# Altium footprint library mastermind.PCBLIB: 1061 footprints (part 8 of 67)
Each footprint in its own frame and in the unit in brackets; x right, y up, seen from the top. Pads: shape width x height; smd on the part's side, far side on the other; paste and mask are expansions set on the pad; w line width, h text height; cw(c..) or ccw(c..) is an arc to the next point about the centre after c.
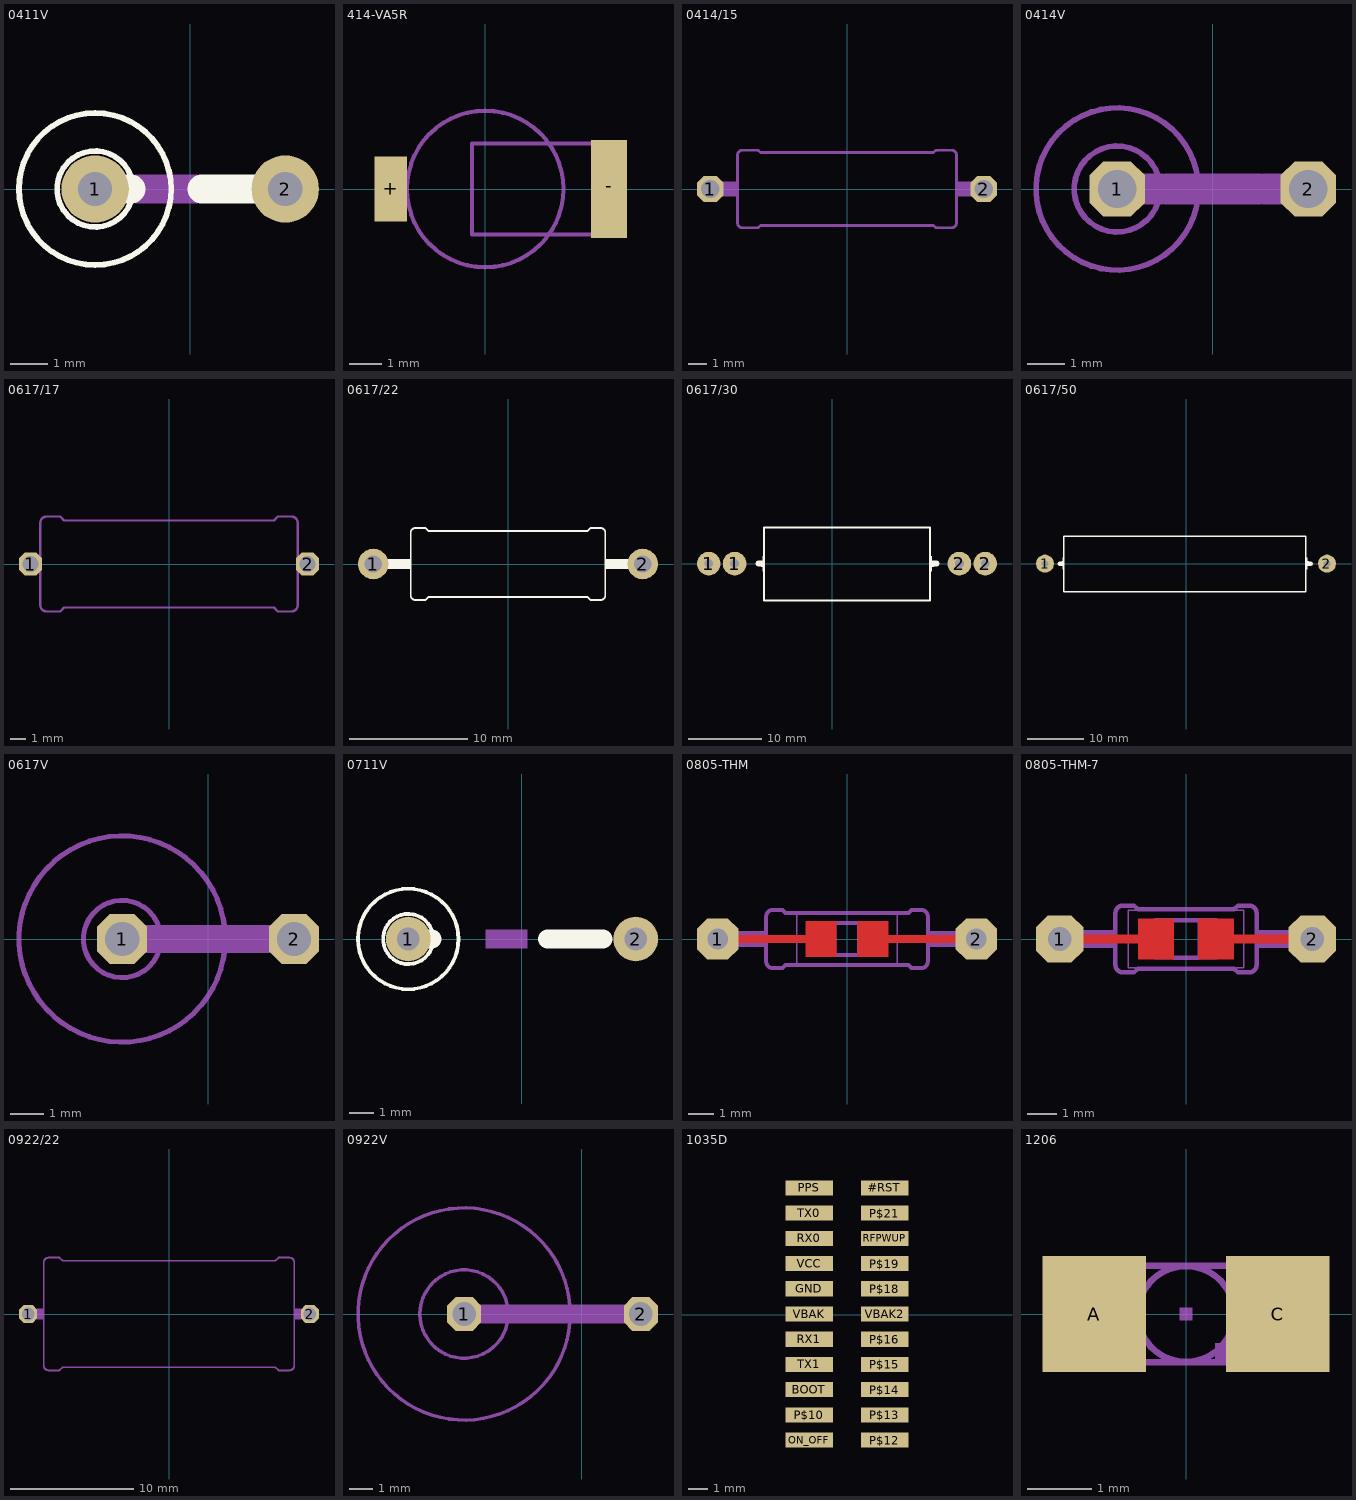
[diagram p7: the footprints below, top view; thin cyan lines are the x and y axes]

## 0411V [mm]
pads (2):
  round 1.8 hole 0.914: 1(-2.54,0) 2(2.54,0)
Top Overlay:
  circle w0.152: c-2.54,0 r2.032
  circle w0.152: c-2.54,0 r1.016
  lines w0.762: -2.54,0 -1.575,0 ; 0.305,0 2.54,0
Mechanical 2:
  region: -1.473,-0.381 -1.473,0.381 0.203,0.381 0.203,-0.381
3D body "Fuse1.STEP": height 11.69, standoff -3, extent -4.44,-1.9 2.895,1.9

## 414-VA5R [mm]
pads (2):
  rect 1x2 smd: +(-2.9,0)
  rect 1.1x3 smd: -(3.8,0)
Mechanical 2:
  circle w0.127: c0,0 r2.4
Mechanical 6:
  lines w0.127: -0.4,-1.4 4.1,-1.4 4.1,1.4 -0.4,1.4 -0.4,-1.4

## 0414/15 [mil]
pads (2):
  oct 58.09x58.09 hole 40: 1(-300,0) 2(300,0)
Mechanical 2:
  region: 240,-16 240,16 256,16 256,-16
  region: -256,-16 -256,16 -240,16 -240,-16
  lines w6: -240,-75 ccw(c-230,-75) -230,-85 -195,-85 -190,-80 190,-80 195,-85 230,-85 ccw(c230,-75) 240,-75 240,75 ccw(c230,75) 230,85 195,85 190,80 -190,80 -195,85 -230,85 ccw(c-230,75) -240,75 -240,-75
Mechanical 8:
  lines w32: -300,0 -260,0 ; 260,0 300,0

## 0414V [mil]
pads (2):
  oct 58.09x58.09 hole 40: 1(-100,0) 2(100,0)
Mechanical 2:
  circle w6: c-100,0 r85
  region: -51,-16 -51,16 51,16 51,-16
Mechanical 8:
  circle w6: c-100,0 r45
  lines w32: -100,0 -55,0 ; 55,0 100,0

## 0617/17 [mil]
pads (2):
  oct 58.09x58.09 hole 40: 1(-350,0) 2(350,0)
Mechanical 2:
  lines w6: -325,-40 -325,-105 ccw(c-310,-105) -310,-120 -275,-120 -265,-110 265,-110 275,-120 310,-120 ccw(c310,-105) 325,-105 325,-40 ; -325,40 -325,105 cw(c-310,105) -310,120 -275,120 -265,110 265,110 275,120 310,120 cw(c310,105) 325,105 325,40
Mechanical 8:
  region: -336,-16 -336,16 -324,16 -324,-16
  region: 324,-16 324,16 336,16 336,-16
  lines w6: -325,-40 -325,40 ; 325,-40 325,40
  lines w32: -350,0 -340,0 ; 340,0 350,0

## 0617/22 [mm]
pads (2):
  round 2.6 hole 1.476: 1(-11.43,0) 2(11.43,0)
Top Overlay:
  region: -10.185,-0.406 -10.185,0.406 -8.255,0.406 -8.255,-0.406
  region: 8.255,-0.406 8.255,0.406 10.185,0.406 10.185,-0.406
  lines w0.152: -8.255,-2.667 ccw(c-7.874,-2.667) -7.874,-3.048 -6.985,-3.048 -6.731,-2.794 6.731,-2.794 6.985,-3.048 7.874,-3.048 ccw(c7.874,-2.667) 8.255,-2.667 8.255,2.667 ccw(c7.874,2.667) 7.874,3.048 6.985,3.048 6.731,2.794 -6.731,2.794 -6.985,3.048 -7.874,3.048 ccw(c-7.874,2.667) -8.255,2.667 -8.255,-2.667
Mechanical 8:
  lines w0.813: -11.43,0 -10.287,0 ; 10.287,0 11.43,0
3D body "User Library-RES-3W.STEP": height 6.5, standoff -3, extent -11.8,-3.3 11.86,3.2

## 0617/30 [mm]
pads (4):
  round 3.2 hole 1.2: 1(-16.75,0) 1(-13.25,0) 2(17.25,0) 2(20.75,0)
Top Overlay:
  region: -9.644,-0.406 -9.644,0.406 -9.34,0.406 -9.34,-0.406
  region: 13.467,-0.406 13.467,0.406 13.771,0.406 13.771,-0.406
  lines w0.152: -9.365,-1.016 -9.365,1.016 ; 13.492,-1.016 13.492,1.016
  lines w0.254: -9.25,-5 13.25,-5 13.25,4.888 -9.25,4.888 -9.25,-5
  lines w0.813: -10,0 -9.746,0 ; 13.873,0 14.127,0
3D body "RES_SQPH_5W_1200mil_0R_J(5%).STEP": height 10, standoff -3.6, extent -13.63,-5 17.75,5

## 0617/50 [mm]
pads (2):
  round 3.2 hole 1.2: 1(-25,0) 2(25,0)
Top Overlay:
  region: -22.044,-0.406 -22.044,0.406 -21.74,0.406 -21.74,-0.406
  region: 21.467,-0.406 21.467,0.406 21.771,0.406 21.771,-0.406
  lines w0.152: -21.765,-1.016 -21.765,1.016 ; 21.492,-1.016 21.492,1.016
  lines w0.254: -21.65,-5 21.25,-5 21.25,4.888 -21.65,4.888 -21.65,-5
  lines w0.813: -22.4,0 -22.146,0 ; 21.873,0 22.127,0
3D body "RES_SQPH_10W_2000mil_0R_J(5%).STEP": height 10, standoff -3.6, extent -25.85,-5 25.85,5

## 0617V [mil]
pads (2):
  oct 58.09x58.09 hole 40: 1(-100,0) 2(100,0)
Mechanical 2:
  circle w6: c-100,0 r120
  region: -52,-16 -52,16 52,16 52,-16
Mechanical 8:
  circle w6: c-100,0 r45
  lines w32: -100,0 -50,0 ; 50,0 100,0

## 0711V [mm]
pads (2):
  round 1.8 hole 0.914: 1(-4.6,0) 2(4.6,0)
Top Overlay:
  circle w0.152: c-4.6,0 r1.016
  circle w0.152: c-4.6,0 r2.032
  lines w0.762: -4.6,0 -3.635,0 ; 1.035,0 3.27,0
Mechanical 2:
  region: -1.473,-0.381 -1.473,0.381 0.203,0.381 0.203,-0.381
3D body "Fuse1.STEP": height 11.69, standoff -3, extent -3.95,-1.9 3.385,1.9

## 0805-THM [mil]
pads (2):
  oct 63.9x63.9 hole 32: 1(-200,0) 2(200,0)
Top Layer:
  region: 16.75,-27.56 16.75,27.56 63.99,27.56 63.99,-27.56
  region: -63.99,-27.56 -63.99,27.56 -16.75,27.56 -16.75,-27.56
  lines w12: -177.17,0 -43.31,0 ; 39.37,0 200.79,0
Top Paste:
  region: 16.75,-27.56 16.75,27.56 63.99,27.56 63.99,-27.56
  region: -63.99,-27.56 -63.99,27.56 -16.75,27.56 -16.75,-27.56
Top Solder:
  region: 12.81,-31.5 12.81,31.5 67.93,31.5 67.93,-31.5
  region: -67.93,-31.5 -67.93,31.5 -12.81,31.5 -12.81,-31.5
Mechanical 2:
  region: -42,-27.5 -42,27.62 -16.41,27.62 -16.41,-27.5
  region: 16,-27.5 16,27.62 41.59,27.62 41.59,-27.5
  region: -159,-12 -159,12 -125,12 -125,-12
  region: 125,-12 125,12 159,12 159,-12
  lines w6: -125,-35 ccw(c-115,-35) -115,-45 -100,-45 -95,-40 95,-40 100,-45 115,-45 ccw(c115,-35) 125,-35 125,35 ccw(c115,35) 115,45 100,45 95,40 -95,40 -100,45 -115,45 ccw(c-115,35) -125,35 -125,-35
Mechanical 8:
  lines w6: -16.14,-25 16.14,-25 ; -16.14,25 16.14,25
  lines w24: -200,0 -160,0 ; 160,0 200,0
Mechanical 29 (Mech34):
  lines w2: -77.68,-38.7 -77.68,38.7 77.68,38.7 77.68,-38.7 -77.68,-38.7

## 0805-THM-7 [mil]
pads (2):
  oct 63.9x63.9 hole 32: 1(-170,0) 2(170,0)
Top Layer:
  region: 16.75,-27.56 16.75,27.56 63.99,27.56 63.99,-27.56
  region: -63.99,-27.56 -63.99,27.56 -16.75,27.56 -16.75,-27.56
  lines w12: -147.17,0 -43.31,0 ; 39.37,0 170.79,0
Top Paste:
  region: 15.75,-27.56 15.75,27.56 64.57,27.56 64.57,-27.56
  region: -64.57,-27.56 -64.57,27.95 -16.14,27.95 -16.14,-27.56
Top Solder:
  region: 12.81,-31.5 12.81,31.5 67.93,31.5 67.93,-31.5
  region: -67.93,-31.5 -67.93,31.5 -12.81,31.5 -12.81,-31.5
Mechanical 2:
  region: -42,-27.5 -42,27.62 -16.41,27.62 -16.41,-27.5
  region: 16,-27.5 16,27.62 41.59,27.62 41.59,-27.5
  region: -129,-12 -129,12 -95,12 -95,-12
  region: 95,-12 95,12 129,12 129,-12
  lines w6: -95,-35 ccw(c-85,-35) -85,-45 -70,-45 -65,-40 65,-40 70,-45 85,-45 ccw(c85,-35) 95,-35 95,35 ccw(c85,35) 85,45 70,45 65,40 -65,40 -70,45 -85,45 ccw(c-85,35) -95,35 -95,-35
Mechanical 8:
  lines w6: -16.14,-25 16.14,-25 ; -16.14,25 16.14,25
  lines w24: -170,0 -130,0 ; 130,0 170,0
Mechanical 29 (Mech34):
  lines w2: -77.68,-38.7 -77.68,38.7 77.68,38.7 77.68,-38.7 -77.68,-38.7

## 0922/22 [mil]
pads (2):
  oct 58.09x58.09 hole 40: 1(-450,0) 2(450,0)
Mechanical 2:
  region: -406,-16 -406,16 -400,16 -400,-16
  region: 400,-16 400,16 406,16 406,-16
  lines w6: -400,-165 ccw(c-385,-165) -385,-180 -350,-180 -340,-170 340,-170 350,-180 385,-180 ccw(c385,-165) 400,-165 400,165 ccw(c385,165) 385,180 350,180 340,170 -340,170 -350,180 -385,180 ccw(c-385,165) -400,165 -400,-165
Mechanical 8:
  region: 400,-16 400,16 422,16 422,-16
  region: -422,-16 -422,16 -400,16 -400,-16
  lines w32: -450,0 -425,0 ; 425,0 450,0

## 0922V [mil]
pads (2):
  oct 58.09x58.09 hole 40: 1(-200,0) 2(100,0)
Mechanical 2:
  circle w6: c-200,0 r75
  circle w6: c-200,0 r180
  region: -150,-16 -150,16 52,16 52,-16
Mechanical 8:
  lines w32: -200,0 -150,0 ; 55,0 100,0

## 1035D [mm]
pads (22):
  rect 2.4x0.76 smd: #RST(16.96,6.39) BOOT(13.15,-3.77) GND(13.15,1.31) ON_OFF(13.15,-6.31) P$10(13.15,-5.04) P$12(16.96,-6.31) P$13(16.96,-5.04) P$14(16.96,-3.77) P$15(16.96,-2.5) P$16(16.96,-1.23) P$18(16.96,1.31) P$19(16.96,2.58) P$21(16.96,5.12) PPS(13.15,6.39) RFPWUP(16.96,3.85) RX0(13.15,3.85) RX1(13.15,-1.23) TX0(13.15,5.12) TX1(13.15,-2.5) VBAK(13.15,0.04) VBAK2(16.96,0.04) VCC(13.15,2.58)

## 1206 [mm]
pads (2):
  rect 1.6x1.803 smd: A(-1.422,0) C(1.422,0)
Mechanical 2:
  region: -0.1,-0.1 -0.1,0.1 0.1,0.1 0.1,-0.1
  region: 0.45,-0.7 0.45,-0.45 0.6,-0.45 0.6,-0.7
  lines w0.102: -0.55,-0.5 ccw(c0,0) 0.55,-0.5 ; -0.55,0.5 cw(c0,0) 0.55,0.5
Mechanical 8:
  region: 0.45,-0.7 0.45,-0.45 0.8,-0.45 0.8,-0.7
  region: 0.8,-0.7 0.8,0.5 0.9,0.5 0.9,-0.7
  region: 0.8,0.55 0.8,0.7 0.9,0.7 0.9,0.55
  region: -0.9,-0.7 -0.9,0.5 -0.8,0.5 -0.8,-0.7
  region: -0.9,0.55 -0.9,0.7 -0.8,0.7 -0.8,0.55
  lines w0.102: -0.55,-0.5 cw(c0,0) -0.55,0.5 ; 0.55,-0.5 ccw(c0,0) 0.55,0.5 ; -1.55,-0.75 1.55,-0.75 1.55,0.75 -1.55,0.75 -1.55,-0.75